# Altium footprint library CeleronLib_SMD.PcbLib: 198 footprints (part 13 of 13)
Each footprint in its own frame and in the unit in brackets; x right, y up, seen from the top. Pads: shape width x height; smd on the part's side, far side on the other; paste and mask are expansions set on the pad; w line width, h text height; cw(c..) or ccw(c..) is an arc to the next point about the centre after c.
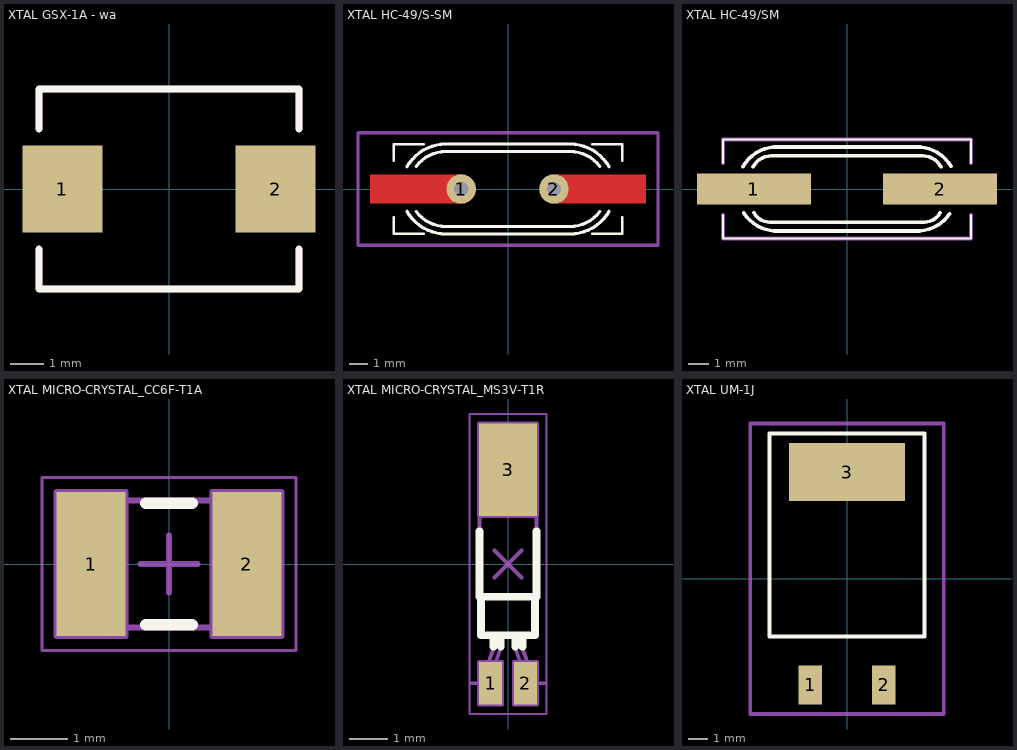
[diagram p12: the footprints below, top view; thin cyan lines are the x and y axes]

## XTAL GSX-1A - wa [mm] "Кварцевый резонатор"
height 1.7
pads (2):
  rect 2.4x2.6 smd: 1(-3.2,0) 2(3.2,0)
Top Overlay:
  lines w0.2: -3.9,-3 -3.9,-1.8 ; -3.9,1.8 -3.9,3 ; -3.875,-3 3.875,-3 ; -3.875,3 3.875,3 ; 3.9,-3 3.9,-1.8 ; 3.9,1.8 3.9,3
Top Courtyard:
  lines w0.2: -3.9,-1.8 -3.9,-3 3.9,-3 3.9,-1.8 ; -3.9,1.8 -3.9,3 3.9,3 3.9,1.8
3D body: height 1.5, standoff 0, extent -3.7,-2.5 3.8,2.5

## XTAL HC-49/S-SM [mil] "SMD и выводной кварцевый резонатор"
height 78.74
pads (2):
  round 62 hole 30: 1(-98.43,0) 2(96.46,0)
Top Layer:
  region: -98.43,30 -290,30 -290,-30 -98.43,-30
  rectangle: 102.36,-30 290,30
Top Overlay:
  lines w5.91: -240,-60 -240,-94 -177.17,-94 ; -240,60 -240,94 -177.17,94 ; 177.17,-94 240,-94 240,-60 ; 177.17,94 240,94 240,60
  lines w7: -212.03,-46.92 ccw(c-129.92,0) -129.92,-94.57 ; -211.96,46.88 cw(c-129.92,0) -129.92,94.49 129.92,94.49 cw(c129.92,0) 211.96,46.88 ; -192.99,-47.3 ccw(c-129.92,0) -129.92,-78.84 ; -192.99,47.3 cw(c-129.92,0) -129.92,78.84 ; -129.92,-94.49 129.92,-94.49 ; -129.92,-78.74 129.92,-78.74 ; -129.92,78.74 129.92,78.74 ; 129.92,-94.57 ccw(c129.92,0) 212.03,-46.92 ; 129.92,-78.84 ccw(c129.92,0) 192.99,-47.3 ; 129.92,78.84 cw(c129.92,0) 192.99,47.3
Top Courtyard:
  lines w7: -314.96,-118.11 -314.96,118.11 314.96,118.11 314.96,-118.11 -314.96,-118.11
3D body: height 143.7, standoff -116.14, extent -218.5,-88.4 213.78,88.41

## XTAL HC-49/SM [mm]
height 2
pads (2):
  rect 5.5x1.5 smd: 1(-4.5,0) 2(4.5,0)
Top Overlay:
  lines w0.1: -6,-1.25 -6,-2.4 -3.9,-2.4 6,-2.4 6,-1.25 ; -6,1.25 -6,2.4 3.9,2.4 6,2.4 6,1.25
  lines w0.178: -5.04,1.069 cw(c-3.394,0.143) -3.299,2.029 ; -4.983,-1.164 ccw(c-3.394,-0.143) -3.299,-2.029 ; -4.541,1.07 cw(c-3.654,0.592) -3.654,1.6 3.654,1.6 cw(c3.654,0.592) 4.541,1.07 ; -4.498,-1.149 ccw(c-3.744,-0.743) -3.744,-1.6 3.744,-1.6 ccw(c3.744,-0.743) 4.498,-1.149 ; -3.394,2.032 3.276,2.032 ; -3.332,-2.032 3.261,-2.032 ; 3.299,-2.029 ccw(c3.394,-0.143) 4.964,-1.193 ; 3.299,2.029 cw(c3.394,0.143) 5.023,1.099
Top Courtyard:
  lines w0.2: -6,-1.25 -6,-2.4 6,-2.4 6,-1.25 ; -6,1.25 -6,2.4 6,2.4 6,1.25
3D body: height 4.31, standoff 0.01, extent -6.4,-2.415 6.4,2.415

## XTAL MICRO-CRYSTAL_CC6F-T1A [mm] "DFN Case Style, Cristal, Body 3.5x2.5mm, CC6F-T1A Serie"
height 0.8
pads (2):
  rect 1.2x2.5 smd: 1(-1.35,0) 2(1.35,0)
Top Overlay:
  lines w0.2: -0.4,-1.05 0.4,-1.05 ; -0.4,1.05 0.4,1.05
Mechanical 8:
  lines w0.1: -1.85,0 -1.35,0 ; -1.35,-0.5 -1.35,0 ; -1.35,0.5 -1.35,0 ; -0.85,0 -1.35,0 ; -0.5,0 0,0 ; 0,-0.5 0,0 ; 0,0.5 0,0 ; 0.5,0 0,0 ; 0.85,0 1.35,0 ; 1.35,-0.5 1.35,0 ; 1.35,0.5 1.35,0 ; 1.85,0 1.35,0 ; -1.95,-1.25 -0.75,-1.25 -0.75,1.25 -1.95,1.25 -1.95,-1.25 ; 0.75,-1.25 1.95,-1.25 1.95,1.25 0.75,1.25 0.75,-1.25
Top Assy:
  lines w0.1: -1.75,-1.05 cw(c-1.75,-1.1) -1.7,-1.1 1.7,-1.1 cw(c1.75,-1.1) 1.75,-1.05 1.75,1.05 cw(c1.75,1.1) 1.7,1.1 -1.7,1.1 cw(c-1.75,1.1) -1.75,1.05 -1.75,-1.05
Top Courtyard:
  lines w0.05: -2.2,-1.5 -2.2,1.5 2.2,1.5 2.2,-1.5 -2.2,-1.5
3D body: height 0.8, standoff 0, extent -1.75,-1.1 1.75,1.1

## XTAL MICRO-CRYSTAL_MS3V-T1R [mm] "2 Pins, 1.4 x 5.2 x 1.4mm , SMD Crystal, MS3V-T1R Serie"
height 1.48
pads (3):
  rect 0.6x1.1 smd: 1(-0.45,-3.1) 2(0.45,-3.1)
  rect 1.5x2.4 smd: 3(0,2.45)
Top Overlay:
  lines w0.2: -0.74,0.85 -0.74,-0.85 0.74,-0.85 0.74,0.85 ; -0.7,-0.85 -0.7,-1.85 0.7,-1.85 0.7,-0.85 ; -0.375,-2.15 -0.375,-1.85 ; -0.187,-2.15 -0.187,-1.85 ; 0.187,-2.15 0.187,-1.85 ; 0.375,-2.15 0.375,-1.85
Mechanical 8:
  lines w0.1: -0.95,-3.1 -0.45,-3.1 ; -0.5,2.45 0,2.45 ; -0.45,-3.6 -0.45,-3.1 ; -0.45,-2.6 -0.45,-3.1 ; -0.354,-0.354 0,0 ; -0.354,0.354 0,0 ; 0,1.95 0,2.45 ; 0,2.95 0,2.45 ; 0.354,-0.354 0,0 ; 0.354,0.354 0,0 ; 0.45,-3.6 0.45,-3.1 ; 0.45,-2.6 0.45,-3.1 ; 0.5,2.45 0,2.45 ; 0.95,-3.1 0.45,-3.1 ; -0.75,-3.65 -0.75,-2.55 -0.15,-2.55 -0.15,-3.65 -0.75,-3.65 ; -0.75,1.25 0.75,1.25 0.75,3.65 -0.75,3.65 -0.75,1.25 ; 0.15,-3.65 0.15,-2.55 0.75,-2.55 0.75,-3.65 0.15,-3.65
Top Assy:
  lines w0.1: -0.7,-0.85 -0.7,-1.85 0.7,-1.85 0.7,-0.85 ; -0.375,-1.85 -0.375,-2.194 -0.594,-2.803 -0.594,-3.35 -0.406,-3.35 -0.406,-2.803 -0.187,-2.194 -0.187,-1.85 ; 0.187,-1.85 0.187,-2.194 0.406,-2.803 0.406,-3.35 0.594,-3.35 0.594,-2.803 0.375,-2.194 0.375,-1.85 ; -0.74,-0.85 0.74,-0.85 0.74,3.35 -0.74,3.35 -0.74,-0.85
Top Courtyard:
  lines w0.05: -1,-3.9 1,-3.9 1,3.9 -1,3.9 -1,-3.9
3D body: height 1.48, standoff 0, extent -0.74,-3.35 0.74,3.35

## XTAL UM-1J [mm] "Crystal"
height 2
pads (3):
  rect 1.2x2 smd: 1(-1.9,-5.5) 2(1.9,-5.5)
  rect 6x3 smd: 3(0,5.5)
Top Overlay:
  lines w0.2: -4,-3 -4,7.5 4,7.5 4,-3 -4,-3
Top Courtyard:
  lines w0.2: -5,-7 5,-7 5,1 5,8 -5,8 -5,4.25 -5,2.75 -5,-1 -5,-7
3D body: height 3.36, standoff 0, extent -3.85,-5.955 3.83,5.856